# Altium footprint library connecteurs.PcbLib: 162 footprints (part 7 of 11)
Each footprint in its own frame and in the unit in brackets; x right, y up, seen from the top. Pads: shape width x height; smd on the part's side, far side on the other; paste and mask are expansions set on the pad; w line width, h text height; cw(c..) or ccw(c..) is an arc to the next point about the centre after c.
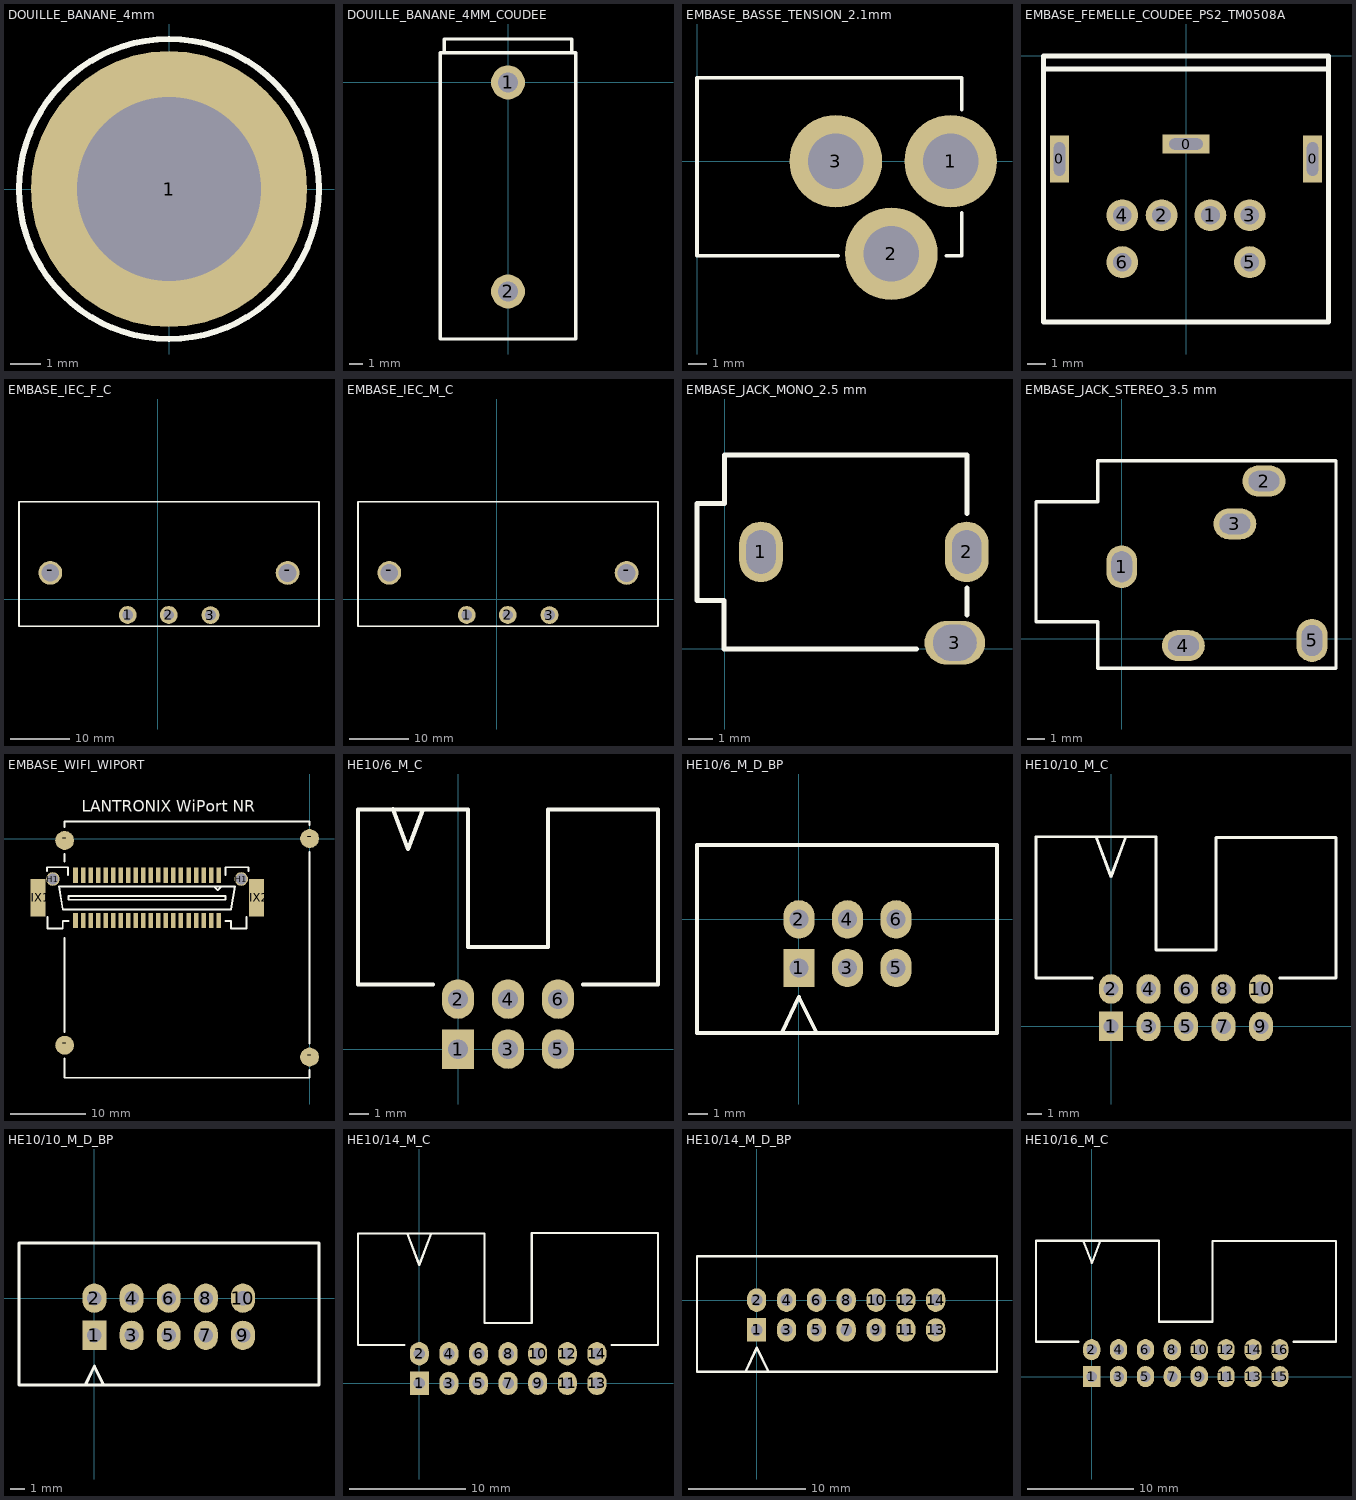
[diagram p6: the footprints below, top view; thin cyan lines are the x and y axes]

## DOUILLE_BANANE_4mm [mm] "DOUILLE BANANE ; DIAMETRE PASSAGE CONTACT = 4 mm ; DIAMETRE PERCAGE = 6 mm"
height 10
pads (1):
  round 9 hole 6: 1(0,0)
Top Overlay:
  circle w0.2: c0,0 r4.892
3D body: height 4.79, standoff -19.04, extent -5.5,-5.6 5.63,5.53

## DOUILLE_BANANE_4MM_COUDEE [mm]
pads (2):
  round 2.5 hole 1.5: 1(0,0) 2(0,-15.4)
Top Overlay:
  lines w0.254: -4.7,2.2 -4.7,3.2 4.7,3.2 4.7,2.2 ; -5,-18.9 -5,2.2 5,2.2 5,-18.9 -5,-18.9

## EMBASE_BASSE_TENSION_2.1mm [mm] "EMBASE D'ALIMENTATION BASSE TENSION ; FEMELLE ; CONTACT REPOS ENTRE 2/3 ; MONTAGE PCB ; COUDE ; ESPACEMENT BROCHES = 6.2mm/5.08mm"
height 10.5
pads (3):
  round 5 hole 3: 1(13.7,0) 2(10.5,-5) 3(7.5,0)
Top Overlay:
  lines w0.2: 7.62,-5.1 0,-5.1 0,4.5 14.3,4.5 14.3,2.794 ; 13.462,-5.1 14.3,-5.1 14.3,-2.794
3D body: height 11.05, standoff -4, extent 0.025,-4.983 14.175,4.6

## EMBASE_FEMELLE_COUDEE_PS2_TM0508A [mm]
height 12
pads (9):
  rect 1x2.5 hole 0.6 slot 1.8 at 90 deg: 0(-6.75,-5.5) 0(6.75,-5.5)
  rect 2.5x1 hole 0.6 slot 1.8 at 0 deg: 0(0,-4.7)
  round 1.7 hole 1: 1(1.3,-8.5) 2(-1.3,-8.5) 3(3.4,-8.5) 4(-3.4,-8.5) 5(3.4,-11) 6(-3.4,-11)
Top Overlay:
  lines w0.254: -7.6,-0.7 7.6,-0.7 ; -7.6,-14.2 7.6,-14.2 7.6,0 -7.6,0 -7.6,-14.2

## EMBASE_IEC_F_C [mm]
pads (5):
  round 3 hole 1.8: 1(-5.031,-2.672) 3(8.9,-2.7)
  round 3 hole 1.7: 2(1.88,-2.68)
  round 4 hole 3: -(-18.052,4.419) -(21.87,4.4)
Top Overlay:
  lines w0.254: -23.31,-4.55 27.15,-4.55 27.15,16.34 -23.31,16.34 -23.31,-4.55

## EMBASE_IEC_M_C [mm]
pads (5):
  round 3 hole 1.8: 1(-5.031,-2.672) 3(8.9,-2.7)
  round 3 hole 1.7: 2(1.88,-2.68)
  round 4 hole 3: -(-18.052,4.419) -(21.87,4.4)
Top Overlay:
  lines w0.254: -23.31,-4.55 -23.31,16.34 27.15,16.34 27.15,-4.55 -23.31,-4.55
3D body: height 27.5, standoff -4, extent -23.07,-4.34 26.93,16.16

## EMBASE_JACK_MONO_2.5 mm [mm] "EMBASE JACK MONO 2.5 mm ; 3 BROCHES ; 1 CONTACT ET 1 GND ; FEMELLE ; COUDEE"
height 9
pads (3):
  oval 1.8x2.5 hole 1.2 slot 1.8 at 90 deg: 1(1.5,4) 2(9.99,4)
  oval 2.5x1.8 hole 1.5 slot 1.8 at 0 deg: 3(9.5,0.25)
Top Overlay:
  lines w0.2: -1.14,2 -0.02,2 ; -1.14,2.01 -1.14,5.99 0,5.99 0,8 10,8 10,5.58 ; -0.02,1.98 -0.02,-0.01 7.93,-0.01 ; 10,1.4 10,2.52

## EMBASE_JACK_STEREO_3.5 mm [mm] "EMBASE JACK STEREO 3.5 mm ; 5 BROCHES ; 2 CONTACTS ET 1 GND ; FEMELLE ; COUDEE"
height 6.2
pads (5):
  oval 1.8x2.5 hole 1.2 slot 1.8 at 90 deg: 1(0,4.2) 5(11.1,-0.1)
  oval 2.5x1.8 hole 1.2 slot 1.8 at 0 deg: 2(8.3,9.2) 3(6.6,6.7) 4(3.6,-0.4)
Top Overlay:
  lines w0.2: -5,1 -1.4,1 -1.4,-1.73 12.5,-1.73 12.5,10.39 -1.4,10.39 -1.4,8 -5,8 -5,6.5 -5,1
3D body: height 6, standoff -3, extent -5.25,-1.5 12.25,10

## EMBASE_WIFI_WIPORT [mm] "Plug Straight with Vacuum pick up clip; 40 Position; Male; Pin spacing=1.00mm"
height 5
pads (48):
  rect 0.6x2 smd: 1(-12.068,-4.874) 2(-12.068,-10.874) 3(-13.068,-4.874) 4(-13.068,-10.874) 5(-14.068,-4.874) 6(-14.068,-10.874) 7(-15.068,-4.874) 8(-15.068,-10.874) 9(-16.068,-4.874) 10(-16.068,-10.874) 11(-17.068,-4.874) 12(-17.068,-10.874) 13(-18.068,-4.874) 14(-18.068,-10.874) 15(-19.068,-4.874) 16(-19.068,-10.874) 17(-20.066,-4.826) 18(-20.068,-10.874) 19(-21.068,-4.874) 20(-21.068,-10.874) 21(-22.068,-4.874) 22(-22.068,-10.874) 23(-23.068,-4.874) 24(-23.068,-10.874) 25(-24.068,-4.874) 26(-24.068,-10.874) 27(-25.068,-4.874) 28(-25.068,-10.874) 29(-26.068,-4.874) 30(-26.068,-10.874) 31(-27.068,-4.874) 32(-27.068,-10.874) 33(-28.068,-4.874) 34(-28.068,-10.874) 35(-29.068,-4.874) 36(-29.068,-10.874) 37(-30.068,-4.874) 38(-30.068,-10.874) 39(-31.068,-4.874) 40(-31.068,-10.874)
  round 2.5 smd: -(-32.512,-27.432) -(-32.512,-0.254) -(0,-29) -(0,0)
  rect 2x5 smd: FIX1(-36.068,-7.874) FIX2(-7.068,-7.874)
  round 1.8 hole 1.4: H1(-34.068,-5.374) H1(-9.068,-5.374)
Top Overlay:
  lines w0.254: -34.878,-4.318 -34.878,-3.81 -32.084,-3.81 -32.084,-4.826 ; -34.798,-10.414 -34.798,-11.938 -32.766,-11.938 -32.766,-10.922 -32.004,-10.922 ; -32.512,-29.21 -32.512,-31.75 0,-31.75 0,-30.734 ; -32.512,-25.654 -32.512,-13.208 ; -32.512,-3.048 -32.512,-2.032 ; -32.512,1.524 -32.512,2.286 0,2.286 0,1.778 ; -12.7,-6.35 -12.192,-6.858 -11.684,-6.35 ; -11.176,-10.922 -10.414,-10.922 -10.414,-11.938 -8.382,-11.938 -8.382,-10.414 ; -11.176,-4.826 -11.176,-3.81 -8.128,-3.81 -8.128,-4.318 ; 0,-27.178 0,-1.778 ; -33.274,-6.35 -9.906,-6.35 -10.414,-9.398 -32.766,-9.398 -33.274,-6.35 ; -32.004,-8.128 -11.176,-8.128 -11.176,-7.62 -32.004,-7.62 -32.004,-8.128
  text "LANTRONIX WiPort NR" at -30.226,3.556 h1.52

## HE10/6_M_C [mm] "HE10 ; 6 CONTACTS ; MALE ; COUDE ; ESPACEMENTS BROCHES = 2.54 mm"
height 9
pads (6):
  rect 1.63x2 hole 1: 1(0,0)
  oval 1.63x2 hole 1: 2(0,2.54) 3(2.54,0) 4(2.54,2.54) 5(5.08,0) 6(5.08,2.54)
Top Overlay:
  lines w0.2: -3.302,12.192 -2.54,10.16 -1.778,12.18 ; -1.27,3.29 -5.08,3.29 -5.08,12.18 0.508,12.18 0.508,5.18 4.572,5.18 4.572,12.18 10.16,12.18 10.16,3.29 6.35,3.29

## HE10/6_M_D_BP [mm] "HE10 ; 6 CONTACTS ; MALE ;  DROIT; BAS PROFIL ; ESPACEMENTS BROCHES = 2.54 mm"
height 9
pads (6):
  rect 1.63x2 hole 1: 1(0,-2.54)
  oval 1.63x2 hole 1: 2(0,0) 3(2.54,-2.54) 4(2.54,0) 5(5.08,-2.54) 6(5.08,0)
Top Overlay:
  lines w0.2: -0.867,-5.896 -0.004,-4.064 0,-4.064 0.907,-5.902 ; -5.33,-5.94 -5.33,3.88 10.36,3.88 10.36,-5.94 -5.33,-5.94
3D body: height 9.1, standoff -3.1, extent -5.13,-5.755 10.11,3.695

## HE10/10_M_C [mm] "HE10 ; 10 CONTACTS ; MALE ; COUDE ; ESPACEMENTS BROCHES = 2.54 mm"
height 9
pads (10):
  rect 1.63x2 hole 1: 1(0,0)
  oval 1.63x2 hole 1: 2(0,2.54) 3(2.54,0) 4(2.54,2.54) 5(5.08,0) 6(5.08,2.54) 7(7.62,0) 8(7.62,2.54) 9(10.16,0) 10(10.16,2.54)
Top Overlay:
  lines w0.2: -1.27,3.29 -5.08,3.29 -5.08,12.85 3.048,12.85 3.048,5.18 7.112,5.18 7.112,12.81 15.24,12.81 15.24,3.29 11.43,3.29 ; -1.003,12.822 0,10.148 1.005,12.829
3D body: height 9.46, standoff -3.24, extent -5.06,-0.3 15.26,12.654

## HE10/10_M_D_BP [mm] "HE10 ; 10 CONTACTS ; MALE ;  DROIT; BAS PROFIL ; ESPACEMENTS BROCHES = 2.54 mm"
height 9
pads (10):
  rect 1.63x2 hole 1: 1(0,-2.54)
  oval 1.63x2 hole 1: 2(0,0) 3(2.54,-2.54) 4(2.54,0) 5(5.08,-2.54) 6(5.08,0) 7(7.62,-2.54) 8(7.62,0) 9(10.16,-2.54) 10(10.16,0)
Top Overlay:
  lines w0.2: -0.607,-5.912 -0.01,-4.644 0.59,-5.86 ; -5.16,-5.95 15.36,-5.95 15.36,3.78 -5.16,3.78 -5.16,-5.95
3D body: height 8.8, standoff -3, extent -5,-5.8 15.2,3.6

## HE10/14_M_C [mm] "HE10 ; 14 CONTACTS ; MALE ; COUDE ; ESPACEMENTS BROCHES = 2.54 mm"
height 9
pads (14):
  rect 1.63x2 hole 1: 1(0,0)
  oval 1.63x2 hole 1: 2(0,2.54) 3(2.54,0) 4(2.54,2.54) 5(5.08,0) 6(5.08,2.54) 7(7.62,0) 8(7.62,2.54) 9(10.16,0) 10(10.16,2.54) 11(12.7,0) 12(12.7,2.54) 13(15.24,0) 14(15.24,2.54)
Top Overlay:
  lines w0.2: -1.27,3.29 -5.26,3.29 -5.26,12.86 5.588,12.86 5.588,5.18 9.652,5.18 9.652,12.9 20.48,12.9 20.48,3.29 16.51,3.29 ; -1.001,12.817 0,10.148 1.003,12.823
3D body: height 9.46, standoff -3.24, extent -5.1,-0.3 20.3,12.654

## HE10/14_M_D_BP [mm] "HE10 ; 14 CONTACTS ; MALE ;  DROIT; BAS PROFIL ; ESPACEMENTS BROCHES = 2.54 mm"
height 9
pads (14):
  rect 1.63x2 hole 1: 1(0,-2.54)
  oval 1.63x2 hole 1: 2(0,0) 3(2.54,-2.54) 4(2.54,0) 5(5.08,-2.54) 6(5.08,0) 7(7.62,-2.54) 8(7.62,0) 9(10.16,-2.54) 10(10.16,0) 11(12.7,-2.54) 12(12.7,0) 13(15.24,-2.54) 14(15.24,0)
Top Overlay:
  lines w0.2: -0.962,-6.107 0,-4.064 1.006,-6.102 ; -5.08,-6.1 20.46,-6.1 20.46,3.74 -5.08,3.74 -5.08,-6.1
3D body: height 8.8, standoff -3, extent -4.98,-5.9 20.3,3.5

## HE10/16_M_C [mm] "HE10 ; 16 CONTACTS ; MALE ; COUDE ; ESPACEMENTS BROCHES = 2.54 mm"
height 9
pads (16):
  rect 1.63x2 hole 1: 1(0,0)
  oval 1.63x2 hole 1: 2(0,2.54) 3(2.54,0) 4(2.54,2.54) 5(5.08,0) 6(5.08,2.54) 7(7.62,0) 8(7.62,2.54) 9(10.16,0) 10(10.16,2.54) 11(12.7,0) 12(12.7,2.54) 13(15.24,0) 14(15.24,2.54) 15(17.78,0) 16(17.78,2.54)
Top Overlay:
  lines w0.2: -1.27,3.29 -5.26,3.29 -5.26,12.83 6.35,12.83 6.35,5.18 11.43,5.18 11.43,12.81 23.08,12.81 23.08,3.29 19.05,3.29 ; -0.752,12.75 0.01,10.718 0.772,12.75
3D body: height 9.46, standoff -3.24, extent -5.07,-0.3 22.87,12.654